# Altium footprint library ICs_imp.PCBLIB: 118 footprints (part 6 of 8)
Each footprint in its own frame and in the unit in brackets; x right, y up, seen from the top. Pads: shape width x height; smd on the part's side, far side on the other; paste and mask are expansions set on the pad; w line width, h text height; cw(c..) or ccw(c..) is an arc to the next point about the centre after c.
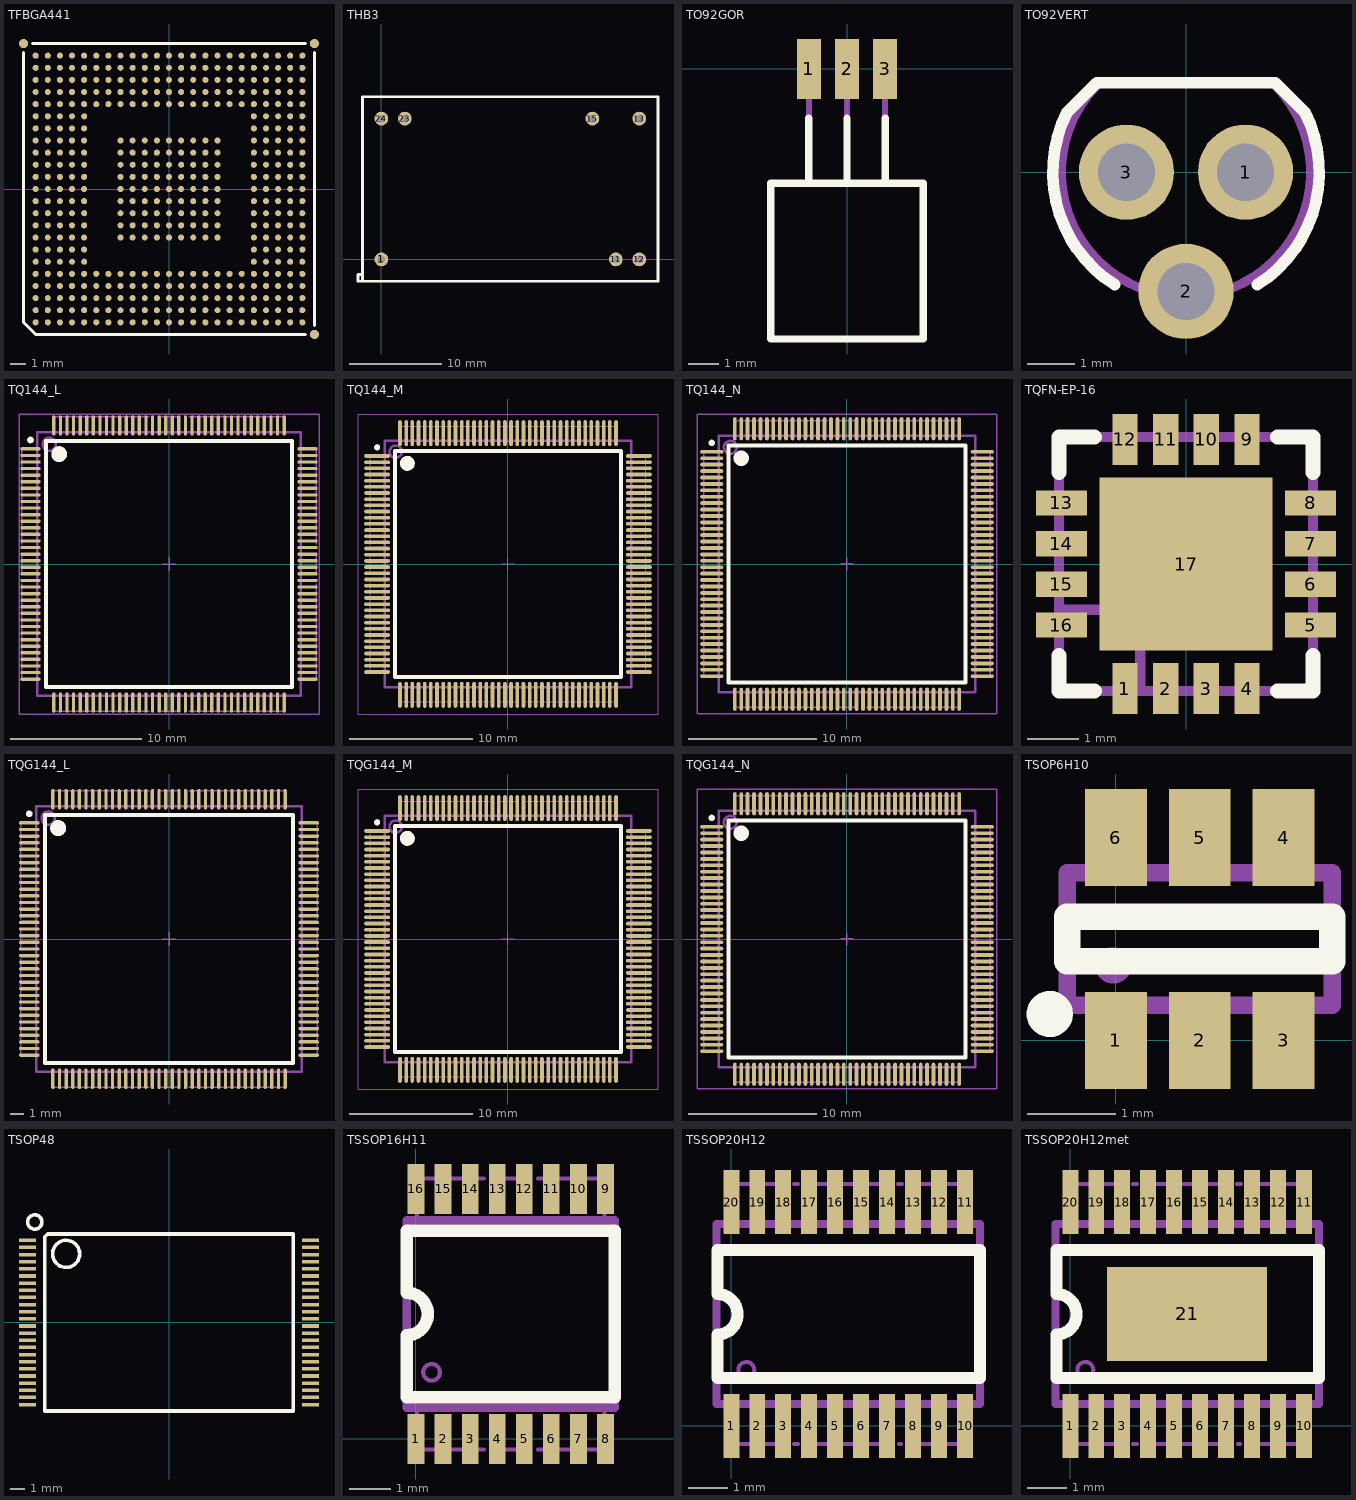
[diagram p5: the footprints below, top view; thin cyan lines are the x and y axes]

## TFBGA441 [mm] "TFBGA441"
pads (444):
  rrect100% 0.4x0.4 smd: A1(-8.8,-8.8) A2(-8.8,-8) A3(-8.8,-7.2) A4(-8.8,-6.4) A5(-8.8,-5.6) A6(-8.8,-4.8) A7(-8.8,-4) A8(-8.8,-3.2) A9(-8.8,-2.4) A10(-8.8,-1.6) A11(-8.8,-0.8) A12(-8.8,0) A13(-8.8,0.8) A14(-8.8,1.6) A15(-8.8,2.4) A16(-8.8,3.2) A17(-8.8,4) A18(-8.8,4.8) A19(-8.8,5.6) A20(-8.8,6.4) A21(-8.8,7.2) A22(-8.8,8) A23(-8.8,8.8) AA1(7.2,-8.8) AA2(7.2,-8) AA3(7.2,-7.2) AA4(7.2,-6.4) AA5(7.2,-5.6) AA6(7.2,-4.8) AA7(7.2,-4) AA8(7.2,-3.2) AA9(7.2,-2.4) AA10(7.2,-1.6) AA11(7.2,-0.8) AA12(7.2,0) AA13(7.2,0.8) AA14(7.2,1.6) AA15(7.2,2.4) AA16(7.2,3.2) AA17(7.2,4) AA18(7.2,4.8) AA19(7.2,5.6) AA20(7.2,6.4) AA21(7.2,7.2) AA22(7.2,8) AA23(7.2,8.8) AB1(8,-8.8) AB2(8,-8) AB3(8,-7.2) AB4(8,-6.4) AB5(8,-5.6) AB6(8,-4.8) AB7(8,-4) AB8(8,-3.2) AB9(8,-2.4) AB10(8,-1.6) AB11(8,-0.8) AB12(8,0) AB13(8,0.8) AB14(8,1.6) AB15(8,2.4) AB16(8,3.2) AB17(8,4) AB18(8,4.8) AB19(8,5.6) AB20(8,6.4) AB21(8,7.2) AB22(8,8) AB23(8,8.8) AC1(8.8,-8.8) AC2(8.8,-8) AC3(8.8,-7.2) AC4(8.8,-6.4) AC5(8.8,-5.6) AC6(8.8,-4.8) AC7(8.8,-4) AC8(8.8,-3.2) AC9(8.8,-2.4) AC10(8.8,-1.6) AC11(8.8,-0.8) AC12(8.8,0) AC13(8.8,0.8) AC14(8.8,1.6) AC15(8.8,2.4) AC16(8.8,3.2) AC17(8.8,4) AC18(8.8,4.8) AC19(8.8,5.6) AC20(8.8,6.4) AC21(8.8,7.2) AC22(8.8,8) AC23(8.8,8.8) B1(-8,-8.8) B2(-8,-8) B3(-8,-7.2) B4(-8,-6.4) B5(-8,-5.6) B6(-8,-4.8) B7(-8,-4) B8(-8,-3.2) B9(-8,-2.4) B10(-8,-1.6) B11(-8,-0.8) B12(-8,0) B13(-8,0.8) B14(-8,1.6) B15(-8,2.4) B16(-8,3.2) B17(-8,4) B18(-8,4.8) B19(-8,5.6) B20(-8,6.4) B21(-8,7.2) B22(-8,8) B23(-8,8.8) C1(-7.2,-8.8) C2(-7.2,-8) C3(-7.2,-7.2) C4(-7.2,-6.4) C5(-7.2,-5.6) C6(-7.2,-4.8) C7(-7.2,-4) C8(-7.2,-3.2) C9(-7.2,-2.4) C10(-7.2,-1.6) C11(-7.2,-0.8) C12(-7.2,0) C13(-7.2,0.8) C14(-7.2,1.6) C15(-7.2,2.4) C16(-7.2,3.2) C17(-7.2,4) C18(-7.2,4.8) C19(-7.2,5.6) C20(-7.2,6.4) C21(-7.2,7.2) C22(-7.2,8) C23(-7.2,8.8) D1(-6.4,-8.8) D2(-6.4,-8) D3(-6.4,-7.2) D4(-6.4,-6.4) D5(-6.4,-5.6) D6(-6.4,-4.8) D7(-6.4,-4) D8(-6.4,-3.2) D9(-6.4,-2.4) D10(-6.4,-1.6) D11(-6.4,-0.8) D12(-6.4,0) D13(-6.4,0.8) D14(-6.4,1.6) D15(-6.4,2.4) D16(-6.4,3.2) D17(-6.4,4) D18(-6.4,4.8) D19(-6.4,5.6) D20(-6.4,6.4) D21(-6.4,7.2) D22(-6.4,8) D23(-6.4,8.8) E1(-5.6,-8.8) E2(-5.6,-8) E3(-5.6,-7.2) E4(-5.6,-6.4) E5(-5.6,-5.6) E6(-5.6,-4.8) E7(-5.6,-4) E8(-5.6,-3.2) E9(-5.6,-2.4) E10(-5.6,-1.6) E11(-5.6,-0.8) E12(-5.6,0) E13(-5.6,0.8) E14(-5.6,1.6) E15(-5.6,2.4) E16(-5.6,3.2) E17(-5.6,4) E18(-5.6,4.8) E19(-5.6,5.6) E20(-5.6,6.4) E21(-5.6,7.2) E22(-5.6,8) E23(-5.6,8.8) F1(-4.8,-8.8) F2(-4.8,-8) F3(-4.8,-7.2) F4(-4.8,-6.4) F5(-4.8,-5.6) F19(-4.8,5.6) F20(-4.8,6.4) F21(-4.8,7.2) F22(-4.8,8) F23(-4.8,8.8) G1(-4,-8.8) G2(-4,-8) G3(-4,-7.2) G4(-4,-6.4) G5(-4,-5.6) G19(-4,5.6) G20(-4,6.4) G21(-4,7.2) G22(-4,8) G23(-4,8.8) H1(-3.2,-8.8) H2(-3.2,-8) H3(-3.2,-7.2) H4(-3.2,-6.4) H5(-3.2,-5.6) H8(-3.2,-3.2) H9(-3.2,-2.4) H10(-3.2,-1.6) H11(-3.2,-0.8) H12(-3.2,0) H13(-3.2,0.8) H14(-3.2,1.6) H15(-3.2,2.4) H16(-3.2,3.2) H19(-3.2,5.6) H20(-3.2,6.4) H21(-3.2,7.2) H22(-3.2,8) H23(-3.2,8.8) J1(-2.4,-8.8) J2(-2.4,-8) J3(-2.4,-7.2) J4(-2.4,-6.4) J5(-2.4,-5.6) J8(-2.4,-3.2) J9(-2.4,-2.4) J10(-2.4,-1.6) J11(-2.4,-0.8) J12(-2.4,0) J13(-2.4,0.8) J14(-2.4,1.6) J15(-2.4,2.4) J16(-2.4,3.2) J19(-2.4,5.6) J20(-2.4,6.4) J21(-2.4,7.2) J22(-2.4,8) J23(-2.4,8.8) K1(-1.6,-8.8) K2(-1.6,-8) K3(-1.6,-7.2) K4(-1.6,-6.4) K5(-1.6,-5.6) K8(-1.6,-3.2) K9(-1.6,-2.4) K10(-1.6,-1.6) K11(-1.6,-0.8) K12(-1.6,0) K13(-1.6,0.8) K14(-1.6,1.6) K15(-1.6,2.4) K16(-1.6,3.2) K19(-1.6,5.6) K20(-1.6,6.4) K21(-1.6,7.2) K22(-1.6,8) K23(-1.6,8.8) L1(-0.8,-8.8) L2(-0.8,-8) L3(-0.8,-7.2) L4(-0.8,-6.4) L5(-0.8,-5.6) L8(-0.8,-3.2) L9(-0.8,-2.4) L10(-0.8,-1.6) L11(-0.8,-0.8) L12(-0.8,0) L13(-0.8,0.8) L14(-0.8,1.6) L15(-0.8,2.4) L16(-0.8,3.2) L19(-0.8,5.6) L20(-0.8,6.4) L21(-0.8,7.2) L22(-0.8,8) L23(-0.8,8.8) M1(0,-8.8) M2(0,-8) M3(0,-7.2) M4(0,-6.4) M5(0,-5.6) M8(0,-3.2) M9(0,-2.4) M10(0,-1.6) M11(0,-0.8) M12(0,0) M13(0,0.8) M14(0,1.6) M15(0,2.4) M16(0,3.2) M19(0,5.6) M20(0,6.4) M21(0,7.2) M22(0,8) M23(0,8.8) N1(0.8,-8.8) N2(0.8,-8) N3(0.8,-7.2) N4(0.8,-6.4) N5(0.8,-5.6) N8(0.8,-3.2) N9(0.8,-2.4) N10(0.8,-1.6) N11(0.8,-0.8) N12(0.8,0) N13(0.8,0.8) N14(0.8,1.6) N15(0.8,2.4) N16(0.8,3.2) N19(0.8,5.6) N20(0.8,6.4) N21(0.8,7.2) N22(0.8,8) N23(0.8,8.8) P1(1.6,-8.8) P2(1.6,-8) P3(1.6,-7.2) P4(1.6,-6.4) P5(1.6,-5.6) P8(1.6,-3.2) P9(1.6,-2.4) P10(1.6,-1.6) P11(1.6,-0.8) P12(1.6,0) P13(1.6,0.8) P14(1.6,1.6) P15(1.6,2.4) P16(1.6,3.2) P19(1.6,5.6) P20(1.6,6.4) P21(1.6,7.2) P22(1.6,8) P23(1.6,8.8) R1(2.4,-8.8) R2(2.4,-8) R3(2.4,-7.2) R4(2.4,-6.4) R5(2.4,-5.6) R8(2.4,-3.2) R9(2.4,-2.4) R10(2.4,-1.6) R11(2.4,-0.8) R12(2.4,0) R13(2.4,0.8) R14(2.4,1.6) R15(2.4,2.4) R16(2.4,3.2) R19(2.4,5.6) R20(2.4,6.4) R21(2.4,7.2) R22(2.4,8) R23(2.4,8.8) T1(3.2,-8.8) T2(3.2,-8) T3(3.2,-7.2) T4(3.2,-6.4) T5(3.2,-5.6) T8(3.2,-3.2) T9(3.2,-2.4) T10(3.2,-1.6) T11(3.2,-0.8) T12(3.2,0) T13(3.2,0.8) T14(3.2,1.6) T15(3.2,2.4) T16(3.2,3.2) T19(3.2,5.6) T20(3.2,6.4) T21(3.2,7.2) T22(3.2,8) T23(3.2,8.8) U1(4,-8.8) U2(4,-8) U3(4,-7.2) U4(4,-6.4) U5(4,-5.6) U19(4,5.6) U20(4,6.4) U21(4,7.2) U22(4,8) U23(4,8.8) V1(4.8,-8.8) V2(4.8,-8) V3(4.8,-7.2) V4(4.8,-6.4) V5(4.8,-5.6) V19(4.8,5.6) V20(4.8,6.4) V21(4.8,7.2) V22(4.8,8) V23(4.8,8.8) W1(5.6,-8.8) W2(5.6,-8) W3(5.6,-7.2) W4(5.6,-6.4) W5(5.6,-5.6) W6(5.6,-4.8) W7(5.6,-4) W8(5.6,-3.2) W9(5.6,-2.4) W10(5.6,-1.6) W11(5.6,-0.8) W12(5.6,0) W13(5.6,0.8) W14(5.6,1.6) W15(5.6,2.4) W16(5.6,3.2) W17(5.6,4) W18(5.6,4.8) W19(5.6,5.6) W20(5.6,6.4) W21(5.6,7.2) W22(5.6,8) W23(5.6,8.8) Y1(6.4,-8.8) Y2(6.4,-8) Y3(6.4,-7.2) Y4(6.4,-6.4) Y5(6.4,-5.6) Y6(6.4,-4.8) Y7(6.4,-4) Y8(6.4,-3.2) Y9(6.4,-2.4) Y10(6.4,-1.6) Y11(6.4,-0.8) Y12(6.4,0) Y13(6.4,0.8) Y14(6.4,1.6) Y15(6.4,2.4) Y16(6.4,3.2) Y17(6.4,4) Y18(6.4,4.8) Y19(6.4,5.6) Y20(6.4,6.4) Y21(6.4,7.2) Y22(6.4,8) Y23(6.4,8.8)
  rrect100% 0.6x0.6 smd: FID1(-9.6,9.6) FID2(9.6,9.6) FID3(9.6,-9.6)
Top Overlay:
  lines w0.203: -9.6,9 -9.6,-8.6 -9.6,-8.8 -8.8,-9.6 -8.6,-9.6 9,-9.6 ; -9,9.6 9,9.6 ; 9.6,-9 9.6,9
3D body: height 1.4, standoff 0.3, extent -9.5,-9.5 9.5,9.5

## THB3 [mm]
height 10
pads (7):
  round 1.5 hole 0.8: 1(0,0) 11(25.4,0) 12(27.94,0) 13(27.94,15.24) 15(22.86,15.24) 23(2.54,15.24) 24(0,15.24)
Top Overlay:
  lines w0.3: -2.03,-1.63 -2.53,-1.63 -2.53,-2.38 -2.03,-2.38 ; -2.03,-2.38 -2.03,17.62 29.97,17.62 29.97,-2.38 -2.03,-2.38
Mechanical 1:
  lines w0.2: -2.03,-2.38 -2.03,17.62 29.97,17.62 29.97,-2.38 -2.03,-2.38
  text "24" at -0.53,14.62 h1.5
  text "1" at -0.03,-0.38 h1.5
  text "13" at 27.47,14.62 h1.5
  text "12" at 26.97,-0.38 h1.5
  text ".Comment" at 10.19,6.5 h1.5
  text ".Designator" at 11.78,8.2 h1.5
3D body "THB3.stp": height 10.01, standoff -3, extent -2.03,-2.38 29.97,17.62

## TO92GOR [mm]
height 5.2
pads (3):
  rect 0.8x2 smd: 1(-1.27,0) 2(0,0) 3(1.27,0)
Top Overlay:
  lines w0.25: -1.27,-3.81 -1.27,-1.651 ; 0,-3.81 0,-1.651 ; 1.27,-3.81 1.27,-1.651 ; -2.54,-9.017 -2.54,-8.763 -2.54,-3.81 2.54,-3.81 2.54,-9.017 -2.54,-9.017
Mechanical 1:
  lines w0.2: -1.27,-3.81 -1.27,0.381 ; 0,-3.81 0,0.381 ; 1.27,-3.81 1.27,0.381 ; -2.54,-9.017 -2.54,-3.81 2.54,-3.81 2.54,-9.017 -2.54,-9.017
  text "3" at 1.039,-5.186 h1.5
  text "2" at -0.381,-5.207 h1.5
  text "1" at -1.628,-5.186 h1.5
  text ".Comment" at -2.794,-10.287 h1.5
  text ".Designator" at -1.143,-7.366 h1.5
3D body "TO92GOR.stp": height 0, standoff -4.18, extent -2.58,-9.01 2.58,0.5

## TO92VERT [mil]
height 342.52
pads (3):
  round 80 hole 48: 1(50,0) 2(0,-100) 3(-50,0)
Top Overlay:
  lines w9.84: -100,50 -75,75 75,75 100,50 ; -99.97,50.06 ccw(c0,0) -59.74,-94.5 ; 59.74,-94.5 ccw(c0,0) 99.97,50.06
Mechanical 1:
  lines w7.87: -75,75 75,75 ; -74,74 ccw(c0,0) 74,74
  text "2" at -28.65,-114.48 h83.33
  text "1" at 21.35,-24.48 h83.33
  text "3" at -78.65,-24.48 h83.33
  text ".Designator" at -49.61,95.28 h59.06
3D body "TO92VERT.stp": height 342.52, standoff -118.11, extent -101.56,-109.82 101.56,62.99

## TQ144_L [mm] "Thin QFP, 144-Leads, Body 20x20mm, Pitch 0.5mm, IPC High Density"
height 1.6
pads (144):
  oval 1.55x0.25 smd: 1(-10.525,8.75) 2(-10.525,8.25) 3(-10.525,7.75) 4(-10.525,7.25) 5(-10.525,6.75) 6(-10.525,6.25) 7(-10.525,5.75) 8(-10.525,5.25) 9(-10.525,4.75) 10(-10.525,4.25) 11(-10.525,3.75) 12(-10.525,3.25) 13(-10.525,2.75) 14(-10.525,2.25) 15(-10.525,1.75) 16(-10.525,1.25) 17(-10.525,0.75) 18(-10.525,0.25) 19(-10.525,-0.25) 20(-10.525,-0.75) 21(-10.525,-1.25) 22(-10.525,-1.75) 23(-10.525,-2.25) 24(-10.525,-2.75) 25(-10.525,-3.25) 26(-10.525,-3.75) 27(-10.525,-4.25) 28(-10.525,-4.75) 29(-10.525,-5.25) 30(-10.525,-5.75) 31(-10.525,-6.25) 32(-10.525,-6.75) 33(-10.525,-7.25) 34(-10.525,-7.75) 35(-10.525,-8.25) 36(-10.525,-8.75) 73(10.525,-8.75) 74(10.525,-8.25) 75(10.525,-7.75) 76(10.525,-7.25) 77(10.525,-6.75) 78(10.525,-6.25) 79(10.525,-5.75) 80(10.525,-5.25) 81(10.525,-4.75) 82(10.525,-4.25) 83(10.525,-3.75) 84(10.525,-3.25) 85(10.525,-2.75) 86(10.525,-2.25) 87(10.525,-1.75) 88(10.525,-1.25) 89(10.525,-0.75) 90(10.525,-0.25) 91(10.525,0.25) 92(10.525,0.75) 93(10.525,1.25) 94(10.525,1.75) 95(10.525,2.25) 96(10.525,2.75) 97(10.525,3.25) 98(10.525,3.75) 99(10.525,4.25) 100(10.525,4.75) 101(10.525,5.25) 102(10.525,5.75) 103(10.525,6.25) 104(10.525,6.75) 105(10.525,7.25) 106(10.525,7.75) 107(10.525,8.25) 108(10.525,8.75)
  oval 0.25x1.55 smd: 37(-8.75,-10.525) 38(-8.25,-10.525) 39(-7.75,-10.525) 40(-7.25,-10.525) 41(-6.75,-10.525) 42(-6.25,-10.525) 43(-5.75,-10.525) 44(-5.25,-10.525) 45(-4.75,-10.525) 46(-4.25,-10.525) 47(-3.75,-10.525) 48(-3.25,-10.525) 49(-2.75,-10.525) 50(-2.25,-10.525) 51(-1.75,-10.525) 52(-1.25,-10.525) 53(-0.75,-10.525) 54(-0.25,-10.525) 55(0.25,-10.525) 56(0.75,-10.525) 57(1.25,-10.525) 58(1.75,-10.525) 59(2.25,-10.525) 60(2.75,-10.525) 61(3.25,-10.525) 62(3.75,-10.525) 63(4.25,-10.525) 64(4.75,-10.525) 65(5.25,-10.525) 66(5.75,-10.525) 67(6.25,-10.525) 68(6.75,-10.525) 69(7.25,-10.525) 70(7.75,-10.525) 71(8.25,-10.525) 72(8.75,-10.525) 109(8.75,10.525) 110(8.25,10.525) 111(7.75,10.525) 112(7.25,10.525) 113(6.75,10.525) 114(6.25,10.525) 115(5.75,10.525) 116(5.25,10.525) 117(4.75,10.525) 118(4.25,10.525) 119(3.75,10.525) 120(3.25,10.525) 121(2.75,10.525) 122(2.25,10.525) 123(1.75,10.525) 124(1.25,10.525) 125(0.75,10.525) 126(0.25,10.525) 127(-0.25,10.525) 128(-0.75,10.525) 129(-1.25,10.525) 130(-1.75,10.525) 131(-2.25,10.525) 132(-2.75,10.525) 133(-3.25,10.525) 134(-3.75,10.525) 135(-4.25,10.525) 136(-4.75,10.525) 137(-5.25,10.525) 138(-5.75,10.525) 139(-6.25,10.525) 140(-6.75,10.525) 141(-7.25,10.525) 142(-7.75,10.525) 143(-8.25,10.525) 144(-8.75,10.525)
Top Overlay:
  circle w0.25: c-10.525,9.425 r0.125
  circle w0.6: c-8.35,8.35 r0.3
  lines w0.3: -9.35,-9.35 -9.35,9.35 9.35,9.35 9.35,-9.35 -9.35,-9.35
Mechanical 1:
  circle w0.2: c-9.1,9.1 r0.5
  lines w0.1: -11.176,-8.763 -11.176,-1.5 ; -11.176,-0.762 -11.176,0.762 ; -11.176,1.5 -11.176,8.763 ; -8.763,-11.176 -1.5,-11.176 ; -8.763,11.176 -1.5,11.176 ; -0.762,-11.176 0.762,-11.176 ; -0.762,11.176 0.762,11.176 ; 1.5,-11.176 8.763,-11.176 ; 1.5,11.176 8.763,11.176 ; 11.176,-8.763 11.176,-1.5 ; 11.176,-0.762 11.176,0.762 ; 11.176,1.5 11.176,8.763
  lines w0.2: -11.176,-8.763 -10,-8.763 ; -11.176,8.763 -10,8.763 ; -8.763,-11.176 -8.763,-10 ; -8.763,10 -8.763,11.176 ; 8.763,-11.176 8.763,-10 ; 8.763,10 8.763,11.176 ; 10,-8.763 11.176,-8.763 ; 10,8.763 11.176,8.763 ; -10,-10 10,-10 10,10 -10,10 -10,-10
  text ".Comment" at -2.9,-1.7 h1.5
  text ".Designator" at -1.61,0.85 h1.5
Mechanical 15:
  lines w0.1: -0.5,0 0.5,0 ; 0,-0.5 0,0.5 ; -11.4,-11.4 -11.4,11.4 11.4,11.4 11.4,-11.4 -11.4,-11.4
3D body: height 1.6, standoff 0, extent -10,-10 10,10

## TQ144_M [mm] "Thin QFP, 144-Leads, Body 20x20mm, Pitch 0.5mm, IPC Low Density"
height 1.6
pads (144):
  oval 2.1x0.3 smd: 1(-10.6,8.75) 2(-10.6,8.25) 3(-10.6,7.75) 4(-10.6,7.25) 5(-10.6,6.75) 6(-10.6,6.25) 7(-10.6,5.75) 8(-10.6,5.25) 9(-10.6,4.75) 10(-10.6,4.25) 11(-10.6,3.75) 12(-10.6,3.25) 13(-10.6,2.75) 14(-10.6,2.25) 15(-10.6,1.75) 16(-10.6,1.25) 17(-10.6,0.75) 18(-10.6,0.25) 19(-10.6,-0.25) 20(-10.6,-0.75) 21(-10.6,-1.25) 22(-10.6,-1.75) 23(-10.6,-2.25) 24(-10.6,-2.75) 25(-10.6,-3.25) 26(-10.6,-3.75) 27(-10.6,-4.25) 28(-10.6,-4.75) 29(-10.6,-5.25) 30(-10.6,-5.75) 31(-10.6,-6.25) 32(-10.6,-6.75) 33(-10.6,-7.25) 34(-10.6,-7.75) 35(-10.6,-8.25) 36(-10.6,-8.75) 73(10.6,-8.75) 74(10.6,-8.25) 75(10.6,-7.75) 76(10.6,-7.25) 77(10.6,-6.75) 78(10.6,-6.25) 79(10.6,-5.75) 80(10.6,-5.25) 81(10.6,-4.75) 82(10.6,-4.25) 83(10.6,-3.75) 84(10.6,-3.25) 85(10.6,-2.75) 86(10.6,-2.25) 87(10.6,-1.75) 88(10.6,-1.25) 89(10.6,-0.75) 90(10.6,-0.25) 91(10.6,0.25) 92(10.6,0.75) 93(10.6,1.25) 94(10.6,1.75) 95(10.6,2.25) 96(10.6,2.75) 97(10.6,3.25) 98(10.6,3.75) 99(10.6,4.25) 100(10.6,4.75) 101(10.6,5.25) 102(10.6,5.75) 103(10.6,6.25) 104(10.6,6.75) 105(10.6,7.25) 106(10.6,7.75) 107(10.6,8.25) 108(10.6,8.75)
  oval 0.3x2.1 smd: 37(-8.75,-10.6) 38(-8.25,-10.6) 39(-7.75,-10.6) 40(-7.25,-10.6) 41(-6.75,-10.6) 42(-6.25,-10.6) 43(-5.75,-10.6) 44(-5.25,-10.6) 45(-4.75,-10.6) 46(-4.25,-10.6) 47(-3.75,-10.6) 48(-3.25,-10.6) 49(-2.75,-10.6) 50(-2.25,-10.6) 51(-1.75,-10.6) 52(-1.25,-10.6) 53(-0.75,-10.6) 54(-0.25,-10.6) 55(0.25,-10.6) 56(0.75,-10.6) 57(1.25,-10.6) 58(1.75,-10.6) 59(2.25,-10.6) 60(2.75,-10.6) 61(3.25,-10.6) 62(3.75,-10.6) 63(4.25,-10.6) 64(4.75,-10.6) 65(5.25,-10.6) 66(5.75,-10.6) 67(6.25,-10.6) 68(6.75,-10.6) 69(7.25,-10.6) 70(7.75,-10.6) 71(8.25,-10.6) 72(8.75,-10.6) 109(8.75,10.6) 110(8.25,10.6) 111(7.75,10.6) 112(7.25,10.6) 113(6.75,10.6) 114(6.25,10.6) 115(5.75,10.6) 116(5.25,10.6) 117(4.75,10.6) 118(4.25,10.6) 119(3.75,10.6) 120(3.25,10.6) 121(2.75,10.6) 122(2.25,10.6) 123(1.75,10.6) 124(1.25,10.6) 125(0.75,10.6) 126(0.25,10.6) 127(-0.25,10.6) 128(-0.75,10.6) 129(-1.25,10.6) 130(-1.75,10.6) 131(-2.25,10.6) 132(-2.75,10.6) 133(-3.25,10.6) 134(-3.75,10.6) 135(-4.25,10.6) 136(-4.75,10.6) 137(-5.25,10.6) 138(-5.75,10.6) 139(-6.25,10.6) 140(-6.75,10.6) 141(-7.25,10.6) 142(-7.75,10.6) 143(-8.25,10.6) 144(-8.75,10.6)
Top Overlay:
  circle w0.25: c-10.6,9.45 r0.125
  circle w0.6: c-8.15,8.15 r0.3
  lines w0.3: -9.15,-9.15 -9.15,9.15 9.15,9.15 9.15,-9.15 -9.15,-9.15
Mechanical 1:
  circle w0.2: c-9.1,9.1 r0.5
  lines w0.1: -11.176,-8.763 -11.176,-1.5 ; -11.176,-0.762 -11.176,0.762 ; -11.176,1.5 -11.176,8.763 ; -8.763,-11.176 -1.5,-11.176 ; -8.763,11.176 -1.5,11.176 ; -0.762,-11.176 0.762,-11.176 ; -0.762,11.176 0.762,11.176 ; 1.5,-11.176 8.763,-11.176 ; 1.5,11.176 8.763,11.176 ; 11.176,-8.763 11.176,-1.5 ; 11.176,-0.762 11.176,0.762 ; 11.176,1.5 11.176,8.763
  lines w0.2: -11.176,-8.763 -10,-8.763 ; -11.176,8.763 -10,8.763 ; -8.763,-11.176 -8.763,-10 ; -8.763,10 -8.763,11.176 ; 8.763,-11.176 8.763,-10 ; 8.763,10 8.763,11.176 ; 10,-8.763 11.176,-8.763 ; 10,8.763 11.176,8.763 ; -10,-10 -10,10 10,10 10,-10 -10,-10
  text ".Comment" at -2.9,-1.7 h1.5
  text ".Designator" at -1.61,0.85 h1.5
Mechanical 15:
  lines w0.1: -0.5,0 0.5,0 ; 0,-0.5 0,0.5 ; -12.15,-12.15 -12.15,12.15 12.15,12.15 12.15,-12.15 -12.15,-12.15
3D body: height 1.6, standoff 0, extent -10,-10 10,10

## TQ144_N [mm] "Thin QFP, 144-Leads, Body 20x20mm, Pitch 0.5mm, IPC Medium Density"
height 1.6
pads (144):
  oval 1.8x0.3 smd: 1(-10.55,8.75) 2(-10.55,8.25) 3(-10.55,7.75) 4(-10.55,7.25) 5(-10.55,6.75) 6(-10.55,6.25) 7(-10.55,5.75) 8(-10.55,5.25) 9(-10.55,4.75) 10(-10.55,4.25) 11(-10.55,3.75) 12(-10.55,3.25) 13(-10.55,2.75) 14(-10.55,2.25) 15(-10.55,1.75) 16(-10.55,1.25) 17(-10.55,0.75) 18(-10.55,0.25) 19(-10.55,-0.25) 20(-10.55,-0.75) 21(-10.55,-1.25) 22(-10.55,-1.75) 23(-10.55,-2.25) 24(-10.55,-2.75) 25(-10.55,-3.25) 26(-10.55,-3.75) 27(-10.55,-4.25) 28(-10.55,-4.75) 29(-10.55,-5.25) 30(-10.55,-5.75) 31(-10.55,-6.25) 32(-10.55,-6.75) 33(-10.55,-7.25) 34(-10.55,-7.75) 35(-10.55,-8.25) 36(-10.55,-8.75) 73(10.55,-8.75) 74(10.55,-8.25) 75(10.55,-7.75) 76(10.55,-7.25) 77(10.55,-6.75) 78(10.55,-6.25) 79(10.55,-5.75) 80(10.55,-5.25) 81(10.55,-4.75) 82(10.55,-4.25) 83(10.55,-3.75) 84(10.55,-3.25) 85(10.55,-2.75) 86(10.55,-2.25) 87(10.55,-1.75) 88(10.55,-1.25) 89(10.55,-0.75) 90(10.55,-0.25) 91(10.55,0.25) 92(10.55,0.75) 93(10.55,1.25) 94(10.55,1.75) 95(10.55,2.25) 96(10.55,2.75) 97(10.55,3.25) 98(10.55,3.75) 99(10.55,4.25) 100(10.55,4.75) 101(10.55,5.25) 102(10.55,5.75) 103(10.55,6.25) 104(10.55,6.75) 105(10.55,7.25) 106(10.55,7.75) 107(10.55,8.25) 108(10.55,8.75)
  oval 0.3x1.8 smd: 37(-8.75,-10.55) 38(-8.25,-10.55) 39(-7.75,-10.55) 40(-7.25,-10.55) 41(-6.75,-10.55) 42(-6.25,-10.55) 43(-5.75,-10.55) 44(-5.25,-10.55) 45(-4.75,-10.55) 46(-4.25,-10.55) 47(-3.75,-10.55) 48(-3.25,-10.55) 49(-2.75,-10.55) 50(-2.25,-10.55) 51(-1.75,-10.55) 52(-1.25,-10.55) 53(-0.75,-10.55) 54(-0.25,-10.55) 55(0.25,-10.55) 56(0.75,-10.55) 57(1.25,-10.55) 58(1.75,-10.55) 59(2.25,-10.55) 60(2.75,-10.55) 61(3.25,-10.55) 62(3.75,-10.55) 63(4.25,-10.55) 64(4.75,-10.55) 65(5.25,-10.55) 66(5.75,-10.55) 67(6.25,-10.55) 68(6.75,-10.55) 69(7.25,-10.55) 70(7.75,-10.55) 71(8.25,-10.55) 72(8.75,-10.55) 109(8.75,10.55) 110(8.25,10.55) 111(7.75,10.55) 112(7.25,10.55) 113(6.75,10.55) 114(6.25,10.55) 115(5.75,10.55) 116(5.25,10.55) 117(4.75,10.55) 118(4.25,10.55) 119(3.75,10.55) 120(3.25,10.55) 121(2.75,10.55) 122(2.25,10.55) 123(1.75,10.55) 124(1.25,10.55) 125(0.75,10.55) 126(0.25,10.55) 127(-0.25,10.55) 128(-0.75,10.55) 129(-1.25,10.55) 130(-1.75,10.55) 131(-2.25,10.55) 132(-2.75,10.55) 133(-3.25,10.55) 134(-3.75,10.55) 135(-4.25,10.55) 136(-4.75,10.55) 137(-5.25,10.55) 138(-5.75,10.55) 139(-6.25,10.55) 140(-6.75,10.55) 141(-7.25,10.55) 142(-7.75,10.55) 143(-8.25,10.55) 144(-8.75,10.55)
Top Overlay:
  circle w0.25: c-10.55,9.45 r0.125
  circle w0.6: c-8.25,8.25 r0.3
  lines w0.3: -9.25,-9.25 -9.25,9.25 9.25,9.25 9.25,-9.25 -9.25,-9.25
Mechanical 1:
  circle w0.2: c-9.1,9.1 r0.5
  lines w0.1: -11.176,-8.763 -11.176,-1.5 ; -11.176,-0.762 -11.176,0.762 ; -11.176,1.5 -11.176,8.763 ; -8.763,-11.176 -1.5,-11.176 ; -8.763,11.176 -1.5,11.176 ; -0.762,-11.176 0.762,-11.176 ; -0.762,11.176 0.762,11.176 ; 1.5,-11.176 8.763,-11.176 ; 1.5,11.176 8.763,11.176 ; 11.176,-8.763 11.176,-1.5 ; 11.176,-0.762 11.176,0.762 ; 11.176,1.5 11.176,8.763
  lines w0.2: -11.176,-8.763 -10,-8.763 ; -11.176,8.763 -10,8.763 ; -8.763,-11.176 -8.763,-10 ; -8.763,10 -8.763,11.176 ; 8.763,-11.176 8.763,-10 ; 8.763,10 8.763,11.176 ; 10,-8.763 11.176,-8.763 ; 10,8.763 11.176,8.763 ; -10,-10 -10,10 10,10 10,-10 -10,-10
  text ".Comment" at -2.9,-1.7 h1.5
  text ".Designator" at -1.61,0.85 h1.5
Mechanical 15:
  lines w0.1: -0.5,0 0.5,0 ; 0,-0.5 0,0.5 ; -11.7,-11.7 -11.7,11.7 11.7,11.7 11.7,-11.7 -11.7,-11.7
3D body: height 1.6, standoff 0, extent -10,-10 10,10

## TQFN-EP-16 [mm]
height 0.8
pads (17):
  rect 0.5x1 smd: 1(-1.2,-2.45) 2(-0.4,-2.45) 3(0.4,-2.45) 4(1.2,-2.45) 9(1.2,2.45) 10(0.4,2.45) 11(-0.4,2.45) 12(-1.2,2.45)
  rect 1x0.5 smd: 5(2.45,-1.2) 6(2.45,-0.4) 7(2.45,0.4) 8(2.45,1.2) 13(-2.45,1.2) 14(-2.45,0.4) 15(-2.45,-0.4) 16(-2.45,-1.2)
  rect 3.4x3.4 smd: 17(0,0)
Top Overlay:
  lines w0.3: -2.5,-1.8 -2.5,-2.5 -1.8,-2.5 ; -2.5,1.8 -2.5,2.5 -1.8,2.5 ; 1.8,-2.5 2.5,-2.5 2.5,-1.8 ; 1.8,2.5 2.5,2.5 2.5,1.8
Mechanical 1:
  lines w0.2: -2.5,-0.9 -0.9,-0.9 -0.9,-2.5 ; -2.5,-2.5 -2.5,2.5 2.5,2.5 2.5,-2.5 -2.5,-2.5
  text "13" at -2.26,0.84 h1.5
  text "1" at -1.42,-2.25 h1.5
  text "16" at -2.32,-1.75 h1.5
  text "4" at 1.01,-2.28 h1.5
  text "5" at 1.85,-1.7 h1.5
  text "8" at 1.88,0.89 h1.5
  text "12" at -1.54,1.62 h1.5
  text "9" at 1.04,1.59 h1.5
  text ".Comment" at -2.74,-3.89 h1.5
  text ".Designator" at -1.33,-0.08 h1.5
3D body "TQFN-EP-16.stp": height 0.8, standoff 0, extent -2.55,-2.55 2.55,2.55

## TQG144_L [mm] "Thin QFP, 144-Leads, Body 20x20mm, Pitch 0.5mm, IPC High Density"
height 1.6
pads (144):
  oval 1.55x0.25 smd: 1(-10.525,8.75) 2(-10.525,8.25) 3(-10.525,7.75) 4(-10.525,7.25) 5(-10.525,6.75) 6(-10.525,6.25) 7(-10.525,5.75) 8(-10.525,5.25) 9(-10.525,4.75) 10(-10.525,4.25) 11(-10.525,3.75) 12(-10.525,3.25) 13(-10.525,2.75) 14(-10.525,2.25) 15(-10.525,1.75) 16(-10.525,1.25) 17(-10.525,0.75) 18(-10.525,0.25) 19(-10.525,-0.25) 20(-10.525,-0.75) 21(-10.525,-1.25) 22(-10.525,-1.75) 23(-10.525,-2.25) 24(-10.525,-2.75) 25(-10.525,-3.25) 26(-10.525,-3.75) 27(-10.525,-4.25) 28(-10.525,-4.75) 29(-10.525,-5.25) 30(-10.525,-5.75) 31(-10.525,-6.25) 32(-10.525,-6.75) 33(-10.525,-7.25) 34(-10.525,-7.75) 35(-10.525,-8.25) 36(-10.525,-8.75) 73(10.525,-8.75) 74(10.525,-8.25) 75(10.525,-7.75) 76(10.525,-7.25) 77(10.525,-6.75) 78(10.525,-6.25) 79(10.525,-5.75) 80(10.525,-5.25) 81(10.525,-4.75) 82(10.525,-4.25) 83(10.525,-3.75) 84(10.525,-3.25) 85(10.525,-2.75) 86(10.525,-2.25) 87(10.525,-1.75) 88(10.525,-1.25) 89(10.525,-0.75) 90(10.525,-0.25) 91(10.525,0.25) 92(10.525,0.75) 93(10.525,1.25) 94(10.525,1.75) 95(10.525,2.25) 96(10.525,2.75) 97(10.525,3.25) 98(10.525,3.75) 99(10.525,4.25) 100(10.525,4.75) 101(10.525,5.25) 102(10.525,5.75) 103(10.525,6.25) 104(10.525,6.75) 105(10.525,7.25) 106(10.525,7.75) 107(10.525,8.25) 108(10.525,8.75)
  oval 0.25x1.55 smd: 37(-8.75,-10.525) 38(-8.25,-10.525) 39(-7.75,-10.525) 40(-7.25,-10.525) 41(-6.75,-10.525) 42(-6.25,-10.525) 43(-5.75,-10.525) 44(-5.25,-10.525) 45(-4.75,-10.525) 46(-4.25,-10.525) 47(-3.75,-10.525) 48(-3.25,-10.525) 49(-2.75,-10.525) 50(-2.25,-10.525) 51(-1.75,-10.525) 52(-1.25,-10.525) 53(-0.75,-10.525) 54(-0.25,-10.525) 55(0.25,-10.525) 56(0.75,-10.525) 57(1.25,-10.525) 58(1.75,-10.525) 59(2.25,-10.525) 60(2.75,-10.525) 61(3.25,-10.525) 62(3.75,-10.525) 63(4.25,-10.525) 64(4.75,-10.525) 65(5.25,-10.525) 66(5.75,-10.525) 67(6.25,-10.525) 68(6.75,-10.525) 69(7.25,-10.525) 70(7.75,-10.525) 71(8.25,-10.525) 72(8.75,-10.525) 109(8.75,10.525) 110(8.25,10.525) 111(7.75,10.525) 112(7.25,10.525) 113(6.75,10.525) 114(6.25,10.525) 115(5.75,10.525) 116(5.25,10.525) 117(4.75,10.525) 118(4.25,10.525) 119(3.75,10.525) 120(3.25,10.525) 121(2.75,10.525) 122(2.25,10.525) 123(1.75,10.525) 124(1.25,10.525) 125(0.75,10.525) 126(0.25,10.525) 127(-0.25,10.525) 128(-0.75,10.525) 129(-1.25,10.525) 130(-1.75,10.525) 131(-2.25,10.525) 132(-2.75,10.525) 133(-3.25,10.525) 134(-3.75,10.525) 135(-4.25,10.525) 136(-4.75,10.525) 137(-5.25,10.525) 138(-5.75,10.525) 139(-6.25,10.525) 140(-6.75,10.525) 141(-7.25,10.525) 142(-7.75,10.525) 143(-8.25,10.525) 144(-8.75,10.525)
Top Overlay:
  circle w0.25: c-10.525,9.425 r0.125
  circle w0.6: c-8.35,8.35 r0.3
  lines w0.3: -9.35,-9.35 -9.35,9.35 9.35,9.35 9.35,-9.35 -9.35,-9.35
Mechanical 1:
  circle w0.2: c-9.1,9.1 r0.5
  lines w0.1: -11.176,-8.763 -11.176,-1.5 ; -11.176,-0.762 -11.176,0.762 ; -11.176,1.5 -11.176,8.763 ; -8.763,-11.176 -1.5,-11.176 ; -8.763,11.176 -1.5,11.176 ; -0.762,-11.176 0.762,-11.176 ; -0.762,11.176 0.762,11.176 ; 1.5,-11.176 8.763,-11.176 ; 1.5,11.176 8.763,11.176 ; 11.176,-8.763 11.176,-1.5 ; 11.176,-0.762 11.176,0.762 ; 11.176,1.5 11.176,8.763
  lines w0.2: -11.176,-8.763 -10,-8.763 ; -11.176,8.763 -10,8.763 ; -8.763,-11.176 -8.763,-10 ; -8.763,10 -8.763,11.176 ; 8.763,-11.176 8.763,-10 ; 8.763,10 8.763,11.176 ; 10,-8.763 11.176,-8.763 ; 10,8.763 11.176,8.763 ; -10,-10 -10,10 10,10 10,-10 -10,-10
  text ".Designator" at -1.61,0.85 h1.5
  text ".Comment" at -2.9,-1.7 h1.5
Mechanical 15:
  lines w0.1: -0.5,0 0.5,0 ; 0,-0.5 0,0.5
3D body: height 1.6, standoff 0, extent -10,-10 10,10

## TQG144_M [mm] "Thin QFP, 144-Leads, Body 20x20mm, Pitch 0.5mm, IPC Low Density"
height 1.6
pads (144):
  oval 2.1x0.3 smd: 1(-10.6,8.75) 2(-10.6,8.25) 3(-10.6,7.75) 4(-10.6,7.25) 5(-10.6,6.75) 6(-10.6,6.25) 7(-10.6,5.75) 8(-10.6,5.25) 9(-10.6,4.75) 10(-10.6,4.25) 11(-10.6,3.75) 12(-10.6,3.25) 13(-10.6,2.75) 14(-10.6,2.25) 15(-10.6,1.75) 16(-10.6,1.25) 17(-10.6,0.75) 18(-10.6,0.25) 19(-10.6,-0.25) 20(-10.6,-0.75) 21(-10.6,-1.25) 22(-10.6,-1.75) 23(-10.6,-2.25) 24(-10.6,-2.75) 25(-10.6,-3.25) 26(-10.6,-3.75) 27(-10.6,-4.25) 28(-10.6,-4.75) 29(-10.6,-5.25) 30(-10.6,-5.75) 31(-10.6,-6.25) 32(-10.6,-6.75) 33(-10.6,-7.25) 34(-10.6,-7.75) 35(-10.6,-8.25) 36(-10.6,-8.75) 73(10.6,-8.75) 74(10.6,-8.25) 75(10.6,-7.75) 76(10.6,-7.25) 77(10.6,-6.75) 78(10.6,-6.25) 79(10.6,-5.75) 80(10.6,-5.25) 81(10.6,-4.75) 82(10.6,-4.25) 83(10.6,-3.75) 84(10.6,-3.25) 85(10.6,-2.75) 86(10.6,-2.25) 87(10.6,-1.75) 88(10.6,-1.25) 89(10.6,-0.75) 90(10.6,-0.25) 91(10.6,0.25) 92(10.6,0.75) 93(10.6,1.25) 94(10.6,1.75) 95(10.6,2.25) 96(10.6,2.75) 97(10.6,3.25) 98(10.6,3.75) 99(10.6,4.25) 100(10.6,4.75) 101(10.6,5.25) 102(10.6,5.75) 103(10.6,6.25) 104(10.6,6.75) 105(10.6,7.25) 106(10.6,7.75) 107(10.6,8.25) 108(10.6,8.75)
  oval 0.3x2.1 smd: 37(-8.75,-10.6) 38(-8.25,-10.6) 39(-7.75,-10.6) 40(-7.25,-10.6) 41(-6.75,-10.6) 42(-6.25,-10.6) 43(-5.75,-10.6) 44(-5.25,-10.6) 45(-4.75,-10.6) 46(-4.25,-10.6) 47(-3.75,-10.6) 48(-3.25,-10.6) 49(-2.75,-10.6) 50(-2.25,-10.6) 51(-1.75,-10.6) 52(-1.25,-10.6) 53(-0.75,-10.6) 54(-0.25,-10.6) 55(0.25,-10.6) 56(0.75,-10.6) 57(1.25,-10.6) 58(1.75,-10.6) 59(2.25,-10.6) 60(2.75,-10.6) 61(3.25,-10.6) 62(3.75,-10.6) 63(4.25,-10.6) 64(4.75,-10.6) 65(5.25,-10.6) 66(5.75,-10.6) 67(6.25,-10.6) 68(6.75,-10.6) 69(7.25,-10.6) 70(7.75,-10.6) 71(8.25,-10.6) 72(8.75,-10.6) 109(8.75,10.6) 110(8.25,10.6) 111(7.75,10.6) 112(7.25,10.6) 113(6.75,10.6) 114(6.25,10.6) 115(5.75,10.6) 116(5.25,10.6) 117(4.75,10.6) 118(4.25,10.6) 119(3.75,10.6) 120(3.25,10.6) 121(2.75,10.6) 122(2.25,10.6) 123(1.75,10.6) 124(1.25,10.6) 125(0.75,10.6) 126(0.25,10.6) 127(-0.25,10.6) 128(-0.75,10.6) 129(-1.25,10.6) 130(-1.75,10.6) 131(-2.25,10.6) 132(-2.75,10.6) 133(-3.25,10.6) 134(-3.75,10.6) 135(-4.25,10.6) 136(-4.75,10.6) 137(-5.25,10.6) 138(-5.75,10.6) 139(-6.25,10.6) 140(-6.75,10.6) 141(-7.25,10.6) 142(-7.75,10.6) 143(-8.25,10.6) 144(-8.75,10.6)
Top Overlay:
  circle w0.25: c-10.6,9.45 r0.125
  circle w0.6: c-8.15,8.15 r0.3
  lines w0.3: -9.15,-9.15 -9.15,9.15 9.15,9.15 9.15,-9.15 -9.15,-9.15
Mechanical 1:
  circle w0.2: c-9.1,9.1 r0.5
  lines w0.1: -11.176,-8.763 -11.176,-1.5 ; -11.176,-0.762 -11.176,0.762 ; -11.176,1.5 -11.176,8.763 ; -8.763,-11.176 -1.5,-11.176 ; -8.763,11.176 -1.5,11.176 ; -0.762,-11.176 0.762,-11.176 ; -0.762,11.176 0.762,11.176 ; 1.5,-11.176 8.763,-11.176 ; 1.5,11.176 8.763,11.176 ; 11.176,-8.763 11.176,-1.5 ; 11.176,-0.762 11.176,0.762 ; 11.176,1.5 11.176,8.763
  lines w0.2: -11.176,-8.763 -10,-8.763 ; -11.176,8.763 -10,8.763 ; -8.763,-11.176 -8.763,-10 ; -8.763,10 -8.763,11.176 ; 8.763,-11.176 8.763,-10 ; 8.763,10 8.763,11.176 ; 10,-8.763 11.176,-8.763 ; 10,8.763 11.176,8.763 ; -10,-10 10,-10 10,10 -10,10 -10,-10
  text ".Designator" at -1.61,0.85 h1.5
  text ".Comment" at -2.9,-1.7 h1.5
Mechanical 13:
  lines w0.1: 10,-10 10,10
Mechanical 15:
  lines w0.1: -0.5,0 0.5,0 ; 0,-0.5 0,0.5 ; -12.15,-12.15 -12.15,12.15 12.15,12.15 12.15,-12.15 -12.15,-12.15
3D body: height 1.6, standoff 0, extent -10,-10 10,10

## TQG144_N [mm] "Thin QFP, 144-Leads, Body 20x20mm, Pitch 0.5mm, IPC Medium Density"
height 1.6
pads (144):
  oval 1.8x0.3 smd: 1(-10.55,8.75) 2(-10.55,8.25) 3(-10.55,7.75) 4(-10.55,7.25) 5(-10.55,6.75) 6(-10.55,6.25) 7(-10.55,5.75) 8(-10.55,5.25) 9(-10.55,4.75) 10(-10.55,4.25) 11(-10.55,3.75) 12(-10.55,3.25) 13(-10.55,2.75) 14(-10.55,2.25) 15(-10.55,1.75) 16(-10.55,1.25) 17(-10.55,0.75) 18(-10.55,0.25) 19(-10.55,-0.25) 20(-10.55,-0.75) 21(-10.55,-1.25) 22(-10.55,-1.75) 23(-10.55,-2.25) 24(-10.55,-2.75) 25(-10.55,-3.25) 26(-10.55,-3.75) 27(-10.55,-4.25) 28(-10.55,-4.75) 29(-10.55,-5.25) 30(-10.55,-5.75) 31(-10.55,-6.25) 32(-10.55,-6.75) 33(-10.55,-7.25) 34(-10.55,-7.75) 35(-10.55,-8.25) 36(-10.55,-8.75) 73(10.55,-8.75) 74(10.55,-8.25) 75(10.55,-7.75) 76(10.55,-7.25) 77(10.55,-6.75) 78(10.55,-6.25) 79(10.55,-5.75) 80(10.55,-5.25) 81(10.55,-4.75) 82(10.55,-4.25) 83(10.55,-3.75) 84(10.55,-3.25) 85(10.55,-2.75) 86(10.55,-2.25) 87(10.55,-1.75) 88(10.55,-1.25) 89(10.55,-0.75) 90(10.55,-0.25) 91(10.55,0.25) 92(10.55,0.75) 93(10.55,1.25) 94(10.55,1.75) 95(10.55,2.25) 96(10.55,2.75) 97(10.55,3.25) 98(10.55,3.75) 99(10.55,4.25) 100(10.55,4.75) 101(10.55,5.25) 102(10.55,5.75) 103(10.55,6.25) 104(10.55,6.75) 105(10.55,7.25) 106(10.55,7.75) 107(10.55,8.25) 108(10.55,8.75)
  oval 0.3x1.8 smd: 37(-8.75,-10.55) 38(-8.25,-10.55) 39(-7.75,-10.55) 40(-7.25,-10.55) 41(-6.75,-10.55) 42(-6.25,-10.55) 43(-5.75,-10.55) 44(-5.25,-10.55) 45(-4.75,-10.55) 46(-4.25,-10.55) 47(-3.75,-10.55) 48(-3.25,-10.55) 49(-2.75,-10.55) 50(-2.25,-10.55) 51(-1.75,-10.55) 52(-1.25,-10.55) 53(-0.75,-10.55) 54(-0.25,-10.55) 55(0.25,-10.55) 56(0.75,-10.55) 57(1.25,-10.55) 58(1.75,-10.55) 59(2.25,-10.55) 60(2.75,-10.55) 61(3.25,-10.55) 62(3.75,-10.55) 63(4.25,-10.55) 64(4.75,-10.55) 65(5.25,-10.55) 66(5.75,-10.55) 67(6.25,-10.55) 68(6.75,-10.55) 69(7.25,-10.55) 70(7.75,-10.55) 71(8.25,-10.55) 72(8.75,-10.55) 109(8.75,10.55) 110(8.25,10.55) 111(7.75,10.55) 112(7.25,10.55) 113(6.75,10.55) 114(6.25,10.55) 115(5.75,10.55) 116(5.25,10.55) 117(4.75,10.55) 118(4.25,10.55) 119(3.75,10.55) 120(3.25,10.55) 121(2.75,10.55) 122(2.25,10.55) 123(1.75,10.55) 124(1.25,10.55) 125(0.75,10.55) 126(0.25,10.55) 127(-0.25,10.55) 128(-0.75,10.55) 129(-1.25,10.55) 130(-1.75,10.55) 131(-2.25,10.55) 132(-2.75,10.55) 133(-3.25,10.55) 134(-3.75,10.55) 135(-4.25,10.55) 136(-4.75,10.55) 137(-5.25,10.55) 138(-5.75,10.55) 139(-6.25,10.55) 140(-6.75,10.55) 141(-7.25,10.55) 142(-7.75,10.55) 143(-8.25,10.55) 144(-8.75,10.55)
Top Overlay:
  circle w0.6: c-8.25,8.25 r0.3
  circle w0.25: c-10.55,9.45 r0.125
  lines w0.3: -9.25,-9.25 9.25,-9.25 9.25,9.25 -9.25,9.25 -9.25,-9.25
Mechanical 1:
  circle w0.2: c-9.1,9.1 r0.5
  lines w0.1: -11.176,-8.763 -11.176,-1.5 ; -11.176,-0.762 -11.176,0.762 ; -11.176,1.5 -11.176,8.763 ; -8.763,-11.176 -1.5,-11.176 ; -8.763,11.176 -1.5,11.176 ; -0.762,-11.176 0.762,-11.176 ; -0.762,11.176 0.762,11.176 ; 1.5,-11.176 8.763,-11.176 ; 1.5,11.176 8.763,11.176 ; 11.176,-8.763 11.176,-1.5 ; 11.176,-0.762 11.176,0.762 ; 11.176,1.5 11.176,8.763
  lines w0.2: -11.176,-8.763 -10,-8.763 ; -11.176,8.763 -10,8.763 ; -8.763,-11.176 -8.763,-10 ; -8.763,10 -8.763,11.176 ; 8.763,-11.176 8.763,-10 ; 8.763,10 8.763,11.176 ; 10,-8.763 11.176,-8.763 ; 10,8.763 11.176,8.763 ; -10,-10 -10,10 10,10 10,-10 -10,-10
  text ".Designator" at -1.61,0.85 h1.5
  text ".Comment" at -2.9,-1.7 h1.5
Mechanical 15:
  lines w0.1: -0.5,0 0.5,0 ; 0,-0.5 0,0.5 ; -11.7,-11.7 11.7,-11.7 11.7,11.7 -11.7,11.7 -11.7,-11.7
3D body: height 1.6, standoff 0, extent -10,-10 10,10

## TSOP6H10 [mm]
height 1
pads (6):
  rect 0.7x1.1 smd: 1(0,0) 2(0.95,0) 3(1.9,0) 4(1.9,2.3) 5(0.95,2.3) 6(0,2.3)
Top Overlay:
  circle w0.3: c-0.75,0.3 r0.112
  lines w0.3: -0.55,0.9 2.45,0.9 2.45,1.4 -0.55,1.4 -0.55,0.9
Mechanical 1:
  circle w0.25: c-0.03,0.85 r0.08
  lines w0.2: 0,-0.25 0,0.4 ; 0,1.9 0,2.55 ; 0.95,1.9 0.95,2.55 ; 1.9,-0.25 1.9,0.4 ; 1.9,1.9 1.9,2.55 ; -0.55,0.4 -0.55,1.9 2.45,1.9 2.45,0.4 -0.55,0.4 ; 0.95,-0.25 0.95,0.4 0.95,-0.25
  text ".Designator" at -0.24,2.87 h1.5
  text ".Comment" at -1.82,-1.51 h1.5
  text "6" at -1.1,2.2 h1.5
3D body "TSOP6h11.stp": height 1.11, standoff 0, extent -0.5,-0.25 2.4,2.55

## TSOP48 [mm] "TSOP48"
pads (48):
  rect 1.2x0.25 smd: 1(-9.9,5.75) 2(-9.9,5.25) 3(-9.9,4.75) 4(-9.9,4.25) 5(-9.9,3.75) 6(-9.9,3.25) 7(-9.9,2.75) 8(-9.9,2.25) 9(-9.9,1.75) 10(-9.9,1.25) 11(-9.9,0.75) 12(-9.9,0.25) 13(-9.9,-0.25) 14(-9.9,-0.75) 15(-9.9,-1.25) 16(-9.9,-1.75) 17(-9.9,-2.25) 18(-9.9,-2.75) 19(-9.9,-3.25) 20(-9.9,-3.75) 21(-9.9,-4.25) 22(-9.9,-4.75) 23(-9.9,-5.25) 24(-9.9,-5.75) 25(9.9,-5.75) 26(9.9,-5.25) 27(9.9,-4.75) 28(9.9,-4.25) 29(9.9,-3.75) 30(9.9,-3.25) 31(9.9,-2.75) 32(9.9,-2.25) 33(9.9,-1.75) 34(9.9,-1.25) 35(9.9,-0.75) 36(9.9,-0.25) 37(9.9,0.25) 38(9.9,0.75) 39(9.9,1.25) 40(9.9,1.75) 41(9.9,2.25) 42(9.9,2.75) 43(9.9,3.25) 44(9.9,3.75) 45(9.9,4.25) 46(9.9,4.75) 47(9.9,5.25) 48(9.9,5.75)
Top Overlay:
  circle w0.254: c-7.2,4.8 r0.949
  circle w0.254: c-9.397,7.032 r0.5
  lines w0.254: -8.7,-6.195 -8.7,5.99 -8.495,6.195 8.695,6.195 8.695,-6.195 -8.7,-6.195
3D body "User Library-TSOP48-1.STEP": height 1.21, standoff 0.01, extent -10.1,-6.05 10.1,6.05

## TSSOP16H11 [mm]
height 1.1
pads (16):
  rect 0.4x1.2 smd: 1(0,0) 2(0.65,0) 3(1.3,0) 4(1.95,0) 5(2.6,0) 6(3.25,0) 7(3.9,0) 8(4.55,0) 9(4.55,6) 10(3.9,6) 11(3.25,6) 12(2.6,6) 13(1.95,6) 14(1.3,6) 15(0.65,6) 16(0,6)
Top Overlay:
  lines w0.3: -0.225,1 4.775,1 4.775,5 -0.225,5 -0.225,3.508 cw(c-0.225,3) -0.225,2.492 -0.225,1
Mechanical 1:
  circle w0.1: c0.375,1.6 r0.2
  lines w0.1: 0.025,0.75 0.025,-0.25 1.625,-0.25 ; 0.025,5.25 0.025,6.25 1.625,6.25 ; 2.075,-0.25 2.475,-0.25 ; 2.075,6.25 2.475,6.25 ; 2.925,-0.25 4.525,-0.25 4.525,0.75 ; 2.925,6.25 4.525,6.25 4.525,5.25
  lines w0.2: -0.225,0.75 4.775,0.75 4.775,5.25 -0.225,5.25 -0.225,0.75
  text "16" at 0.2,3.87 h1.5
  text ".Comment" at 0.36,2.1 h1.5
  text ".Designator" at 1.62,3.58 h1.5
3D body "TSSOP16h11.stp": height 1.11, standoff 0, extent -0.375,-0.3 4.925,6.3

## TSSOP20H12 [mm]
height 1.2
pads (20):
  rect 0.4x1.6 smd: 1(0,0) 2(0.65,0) 3(1.3,0) 4(1.95,0) 5(2.6,0) 6(3.25,0) 7(3.9,0) 8(4.55,0) 9(5.2,0) 10(5.85,0) 11(5.85,5.6) 12(5.2,5.6) 13(4.55,5.6) 14(3.9,5.6) 15(3.25,5.6) 16(2.6,5.6) 17(1.95,5.6) 18(1.3,5.6) 19(0.65,5.6) 20(0,5.6)
Top Overlay:
  lines w0.3: -0.35,1.2 6.225,1.2 6.225,4.4 -0.35,4.4 -0.35,3.3 cw(c-0.35,2.792) -0.35,2.284 -0.35,1.2
Mechanical 1:
  circle w0.1: c0.375,1.4 r0.2
  lines w0.1: 0,6.05 1.3,6.05 ; 0.025,-0.45 1.3,-0.45 ; 1.575,-0.45 1.675,-0.45 ; 1.575,6.05 1.675,6.05 ; 1.95,-0.45 3.9,-0.45 ; 1.95,6.05 3.9,6.05 ; 4.175,6.05 4.275,6.05 ; 4.2,-0.45 4.25,-0.45 ; 4.55,-0.45 5.85,-0.45 ; 4.55,6.05 5.85,6.05
  lines w0.2: 0,-0.45 0,0.55 ; 0,5.05 0,6.05 ; 5.85,-0.45 5.85,0.55 ; 5.85,5.05 5.85,6.05 ; -0.375,0.55 6.225,0.55 6.225,5.05 -0.375,5.05 -0.375,0.55
  text "20" at 0.3,3.55 h1.5
  text ".Comment" at 0.39,1.88 h1.5
  text ".Designator" at 1.98,3.58 h1.5
3D body "TSSOP20h12.stp": height 1.21, standoff 0, extent -0.375,-0.5 6.225,6.1

## TSSOP20H12met [mm]
height 1.2
pads (21):
  rect 0.4x1.6 smd: 1(0,0) 2(0.65,0) 3(1.3,0) 4(1.95,0) 5(2.6,0) 6(3.25,0) 7(3.9,0) 8(4.55,0) 9(5.2,0) 10(5.85,0) 11(5.85,5.6) 12(5.2,5.6) 13(4.55,5.6) 14(3.9,5.6) 15(3.25,5.6) 16(2.6,5.6) 17(1.95,5.6) 18(1.3,5.6) 19(0.65,5.6) 20(0,5.6)
  rect 4x2.35 smd: 21(2.925,2.8)
Top Overlay:
  lines w0.3: -0.35,1.2 -0.35,2.284 ccw(c-0.35,2.792) -0.35,3.3 -0.35,4.4 6.225,4.4 6.225,1.2 -0.35,1.2
Mechanical 1:
  circle w0.1: c0.375,1.4 r0.2
  lines w0.1: 0,6.05 1.3,6.05 ; 0.025,-0.45 1.3,-0.45 ; 1.575,-0.45 1.675,-0.45 ; 1.575,6.05 1.675,6.05 ; 1.95,-0.45 3.9,-0.45 ; 1.95,6.05 3.9,6.05 ; 4.175,6.05 4.275,6.05 ; 4.2,-0.45 4.25,-0.45 ; 4.55,-0.45 5.85,-0.45 ; 4.55,6.05 5.85,6.05
  lines w0.2: 0,-0.45 0,0.55 ; 0,5.05 0,6.05 ; 5.85,-0.45 5.85,0.55 ; 5.85,5.05 5.85,6.05 ; -0.375,0.55 -0.375,5.05 6.225,5.05 6.225,0.55 -0.375,0.55
  text "20" at 0.3,3.55 h1.5
  text ".Comment" at 0.21,1.91 h1.5
  text ".Designator" at 1.8,3.61 h1.5
3D body "TSSOP20h12.stp": height 1.21, standoff 0, extent -0.375,-0.5 6.225,6.1